# Altium footprint library Capacitors.PcbLib: 31 footprints (part 1 of 2)
Each footprint in its own frame and in the unit in brackets; x right, y up, seen from the top. Pads: shape width x height; smd on the part's side, far side on the other; paste and mask are expansions set on the pad; w line width, h text height; cw(c..) or ccw(c..) is an arc to the next point about the centre after c.
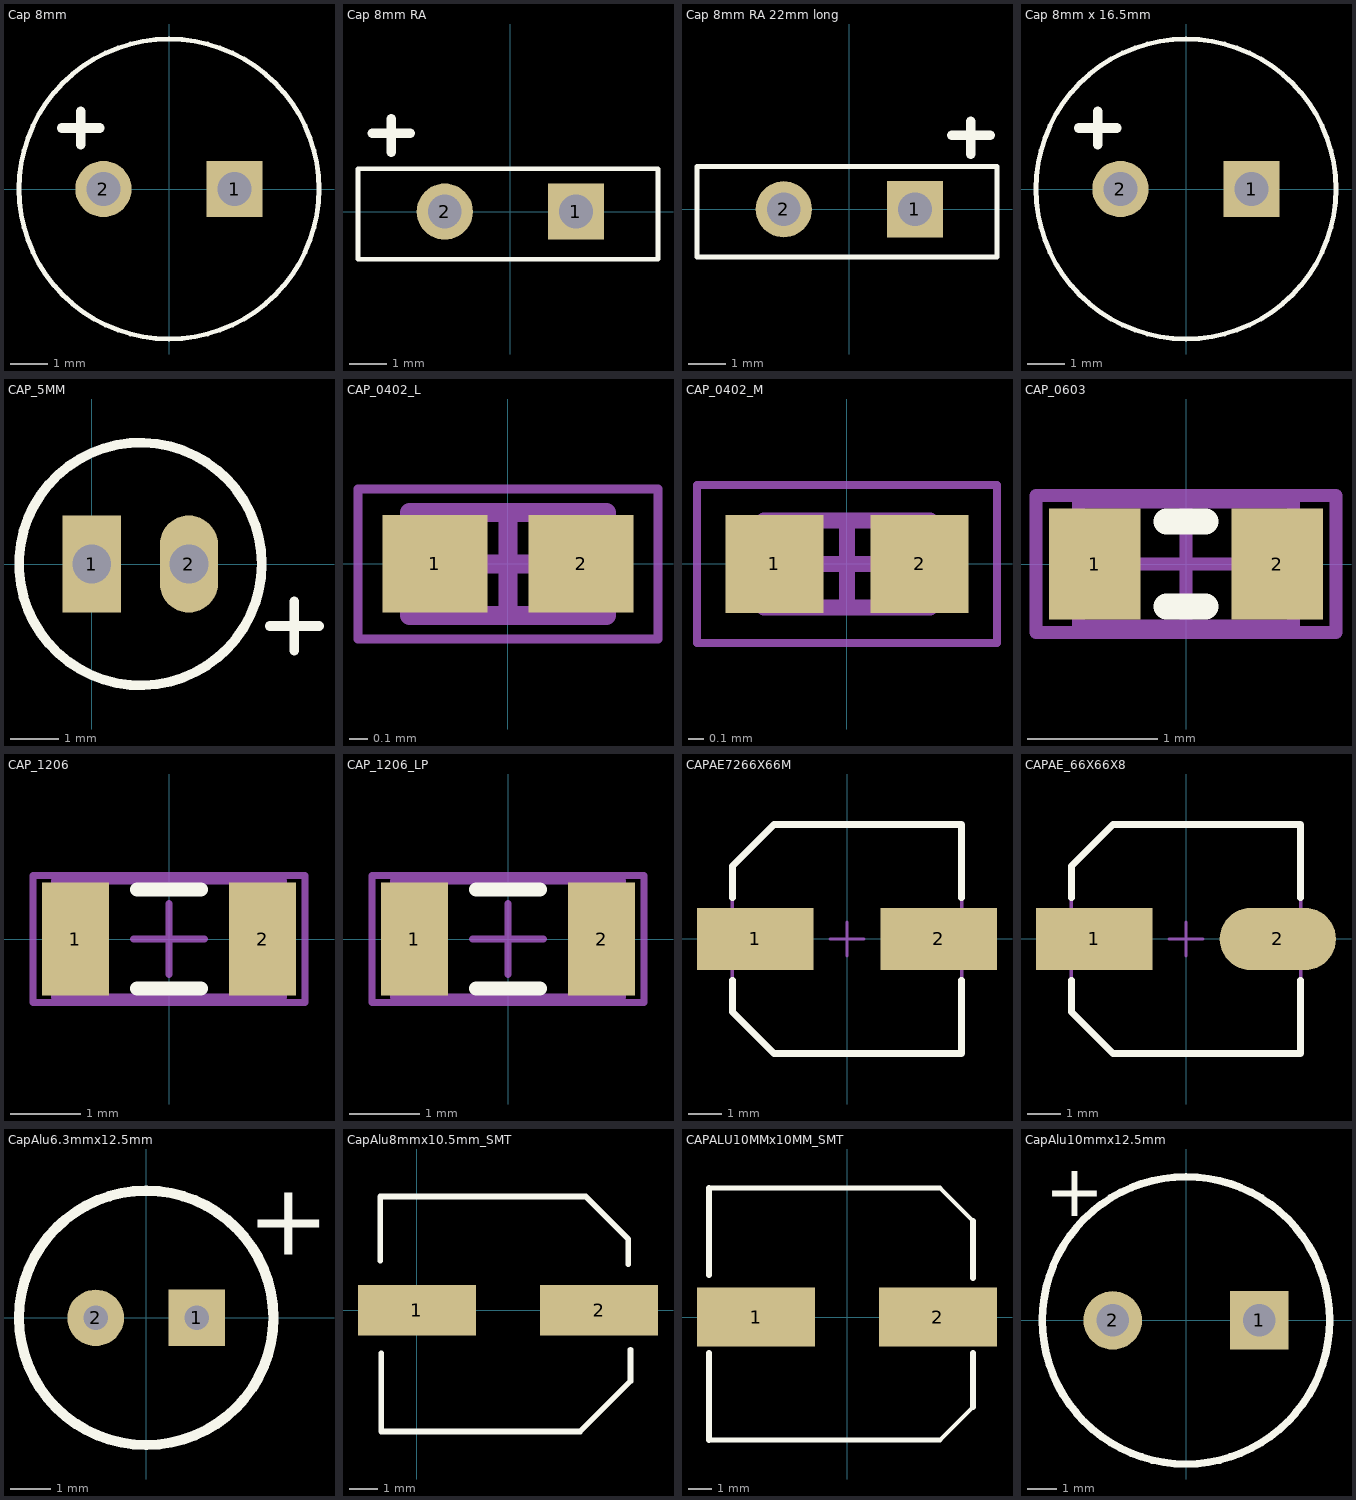
[diagram p0: the footprints below, top view; thin cyan lines are the x and y axes]

## Cap 8mm [mm]
height 22
pads (2):
  rect 1.5x1.5 hole 0.9: 1(1.75,0)
  round 1.5 hole 0.9: 2(-1.75,0)
Top Overlay:
  circle w0.127: c0,0 r4
  lines w0.254: -2.86,1.627 -1.844,1.627 ; -2.356,1.185 -2.356,2.074
3D body "CAP_PAN_8X20.step": height 22, standoff -4.52, extent -4.252,-4.251 4.257,4.251

## Cap 8mm RA [mm]
height 8
pads (2):
  rect 1.5x1.5 hole 0.9: 1(1.75,0)
  round 1.5 hole 0.9: 2(-1.75,0)
Top Overlay:
  lines w0.127: -4.064,-1.27 -4.064,1.143 3.937,1.143 3.937,-1.27 -4.064,-1.27
  lines w0.254: -3.683,2.095 -2.667,2.095 ; -3.175,1.587 -3.175,2.476
3D body "Capacitor.stp": height 8, standoff -2.15, extent -3.992,-0.254 3.992,23.83

## Cap 8mm RA 22mm long [mm]
height 8
pads (2):
  rect 1.5x1.5 hole 0.9: 1(1.75,0)
  round 1.5 hole 0.9: 2(-1.75,0)
Top Overlay:
  lines w0.127: -4.064,-1.27 -4.064,1.143 3.937,1.143 3.937,-1.27 -4.064,-1.27
  lines w0.254: 2.735,1.973 3.751,1.973 ; 3.243,1.465 3.243,2.354
3D body "Capacitor.stp": height 8, standoff -2.15, extent -3.992,-0.254 3.992,23.83

## Cap 8mm x 16.5mm [mm]
height 16.5
pads (2):
  rect 1.5x1.5 hole 0.9: 1(1.75,0)
  round 1.5 hole 0.9: 2(-1.75,0)
Top Overlay:
  circle w0.127: c0,0 r4
  lines w0.254: -2.86,1.627 -1.844,1.627 ; -2.356,1.185 -2.356,2.074
3D body "User Library-CAPAER_D080_L165_P035_W006X030.STEP": height 16.51, standoff -3, extent -3.952,-3.997 4.058,4.003

## CAP_5MM [mm]
pads (2):
  rect 1.2x2 hole 0.8: 1(0,0)
  oval 1.2x2 hole 0.8: 2(2,0)
Top Overlay:
  circle w0.2: c1,0 r2.5
  lines w0.2: 3.664,-1.277 4.68,-1.277 ; 4.172,-1.785 4.172,-0.769
3D body "User Library-Cap electro 5x11x2mm.step": height 11.53, standoff -3.27, extent -1.507,-2.52 3.543,2.53

## CAP_0402_L [mm] "Chip Capacitor, 2-Leads, Body 1.00x0.50mm, IPC High Density"
height 0.55
pads (2):
  rect 0.56x0.52 smd: 1(-0.39,0) 2(0.39,0)
Mechanical 13:
  lines w0.1: -0.525,-0.275 0.525,-0.275 0.525,0.275 -0.525,0.275 -0.525,-0.275
Mechanical 15:
  lines w0.05: -0.8,-0.4 0.8,-0.4 0.8,0.4 -0.8,0.4 -0.8,-0.4
  lines w0.1: -0.275,0 0.275,0 ; 0,-0.275 0,0.275
3D body "CAPC1005X06L.step": height 0.55, standoff 0, extent -0.525,-0.275 0.525,0.275

## CAP_0402_M [mm] "Chip Capacitor, 2-Leads, Body 1.00x0.50mm, IPC Medium Density"
height 0.64
pads (2):
  rect 0.62x0.62 smd: 1(-0.46,0) 2(0.46,0)
Mechanical 13:
  lines w0.1: -0.525,-0.275 -0.525,0.275 0.525,0.275 0.525,-0.275 -0.525,-0.275
Mechanical 15:
  lines w0.05: -0.95,-0.5 -0.95,0.5 0.95,0.5 0.95,-0.5 -0.95,-0.5
  lines w0.1: -0.275,0 0.275,0 ; 0,-0.275 0,0.275
3D body "User Library-0402C.STEP": height 0.36, standoff 0, extent -0.5,-0.265 0.5,0.265

## CAP_0603 [mm] "Chip Capacitor, 2-Leads, Body 1,6x0,8mm, IPC High Density"
height 0.48
pads (2):
  rect 0.7x0.85 smd: 1(-0.7,0) 2(0.7,0)
Top Overlay:
  lines w0.2: -0.15,-0.325 0.15,-0.325 ; -0.15,0.325 0.15,0.325
Mechanical 13:
  lines w0.1: -0.825,-0.475 -0.825,0.475 0.825,0.475 0.825,-0.475 -0.825,-0.475
Mechanical 15:
  lines w0.1: -0.475,0 0.475,0 ; 0,-0.475 0,0.475 ; -1.15,-0.525 -1.15,0.525 1.15,0.525 1.15,-0.525 -1.15,-0.525
3D body "User Library-ECHU_PPS.STEP": height 0.7, standoff 0, extent -0.8,-0.419 0.8,0.381

## CAP_1206 [mm] "Chip Capacitor, 2-Leads, Body 3,1x1,6mm, IPC High Density"
height 0.7
pads (2):
  rect 0.95x1.6 smd: 1(-1.325,0) 2(1.325,0)
Top Overlay:
  lines w0.2: -0.45,-0.7 0.45,-0.7 ; -0.45,0.7 0.45,0.7
Mechanical 13:
  lines w0.1: -1.625,-0.825 1.625,-0.825 1.625,0.825 -1.625,0.825 -1.625,-0.825
Mechanical 15:
  lines w0.1: -0.5,0 0.5,0 ; 0,-0.5 0,0.5 ; -1.925,-0.9 1.925,-0.9 1.925,0.9 -1.925,0.9 -1.925,-0.9
3D body "User Library-cap_1206-1.STEP": height 1.6, standoff 0, extent -1.625,-0.825 1.575,0.775

## CAP_1206_LP [mm] "Chip Capacitor, 2-Leads, Body 3,1x1,6mm, IPC High Density"
height 0.7
pads (2):
  rect 0.95x1.6 smd: 1(-1.325,0) 2(1.325,0)
Top Overlay:
  lines w0.2: -0.45,-0.7 0.45,-0.7 ; -0.45,0.7 0.45,0.7
Mechanical 13:
  lines w0.1: -1.625,-0.825 1.625,-0.825 1.625,0.825 -1.625,0.825 -1.625,-0.825
Mechanical 15:
  lines w0.1: -0.5,0 0.5,0 ; 0,-0.5 0,0.5 ; -1.925,-0.9 1.925,-0.9 1.925,0.9 -1.925,0.9 -1.925,-0.9
3D body "User Library-cap_1206-1.STEP": height 1.6, standoff 0, extent -1.625,-0.825 1.575,0.775

## CAPAE7266X66M [mm] "Aluminum Electrolytic Capacitor, Body 6.60x6.60x6.60mm, IPC Low Density"
height 6.6
pads (2):
  rect 3.45x1.85 smd: 1(-2.725,0) 2(2.725,0)
Top Overlay:
  lines w0.2: -3.4,-1.225 -3.4,-2.163 -2.163,-3.4 3.4,-3.4 3.4,-1.225 ; -3.4,1.225 -3.4,2.163 -2.163,3.4 3.4,3.4 3.4,1.225
Mechanical 13:
  lines w0.1: -3.4,-2.163 -2.163,-3.4 3.4,-3.4 3.4,3.4 -2.163,3.4 -3.4,2.163 -3.4,-2.163
Mechanical 15:
  lines w0.1: -0.5,0 0.5,0 ; 0,-0.5 0,0.5
3D body "User Library-ALU-D.STEP": height 5.4, standoff 0, extent -3.504,-3.301 3.496,3.299

## CAPAE_66X66X8 [mm] "Aluminum Electrolytic Capacitor, Body 6.60x6.60x7.70mm, IPC Low Density"
height 8
pads (2):
  rect 3.45x1.85 smd: 1(-2.725,0)
  oval 3.45x1.85 smd: 2(2.725,0)
Top Overlay:
  lines w0.2: -3.4,-1.225 -3.4,-2.163 -2.163,-3.4 3.4,-3.4 3.4,-1.225 ; -3.4,1.225 -3.4,2.163 -2.163,3.4 3.4,3.4 3.4,1.225
Mechanical 13:
  lines w0.1: -3.4,-2.163 -2.163,-3.4 3.4,-3.4 3.4,3.4 -2.163,3.4 -3.4,2.163 -3.4,-2.163
Mechanical 15:
  lines w0.1: -0.5,0 0.5,0 ; 0,-0.5 0,0.5
3D body "User Library-ALU-D8.STEP": height 7.7, standoff 0, extent -3.555,-3.378 3.445,3.222

## CapAlu6.3mmx12.5mm [mm] "Capacitor Aluminum 6.3mm OD"
height 12.5
pads (2):
  rect 1.4x1.4 hole 0.6: 1(1.25,0)
  round 1.4 hole 0.6: 2(-1.25,0)
Top Overlay:
  circle w0.254: c0,0 r3.15
  text "+" at 2.501,1.563 h1.78
3D body "User Library-Cap-EL(6_3x12-2_5).step": height 12, standoff -3.2, extent -3.153,-3.111 3.149,3.187

## CapAlu8mmx10.5mm_SMT [mm] "Capacitor Aluminum 8mm"
height 10.5
pads (2):
  rect 4.2x1.8 smd: 1(0,0) 2(6.5,0)
Top Overlay:
  lines w0.2: -1.302,1.778 -1.302,4.064 6.023,4.064 7.538,2.549 7.538,1.651 ; -1.271,-1.524 -1.271,-4.318 5.824,-4.318 7.62,-2.522 7.62,-1.397
3D body "User Library-CEL8D85S105H (1).step": height 10.41, standoff 0.2, extent -1.648,-4.236 8.252,4.064

## CAPALU10MMx10MM_SMT [mm]
pads (2):
  rect 5x2.5 smd: 1(-3.85,0) 2(3.85,0)
Top Overlay:
  lines w0.2: -5.842,-5.207 3.937,-5.207 5.334,-3.81 ; -5.842,5.461 3.937,5.461 5.334,4.064
  lines w0.254: -5.842,-5.207 -5.842,-1.524 ; -5.842,1.778 -5.842,5.461 ; 5.334,-3.81 5.334,-1.524 ; 5.334,1.651 5.334,4.064
3D body "User Library-10x10_5.step": height 10.8, standoff 0, extent -5.839,-5.023 5.461,5.277

## CapAlu10mmx12.5mm [mm] "Capacitor Aluminum 10mm OD"
height 12.5
pads (2):
  rect 2x2 hole 1.1: 1(2.5,0)
  round 2 hole 1.1: 2(-2.5,0)
Top Overlay:
  circle w0.254: c0,0 r4.9
  text "+" at -4.826,3.556 h1.78
3D body "User Library-Cap-EL(10x13-5).STEP": height 13, standoff -3.3, extent -5.001,-4.956 5.001,5.032